# Altium footprint library GBA.PcbLib: 115 footprints (part 1 of 8)
Each footprint in its own frame and in the unit in brackets; x right, y up, seen from the top. Pads: shape width x height; smd on the part's side, far side on the other; paste and mask are expansions set on the pad; w line width, h text height; cw(c..) or ccw(c..) is an arc to the next point about the centre after c.
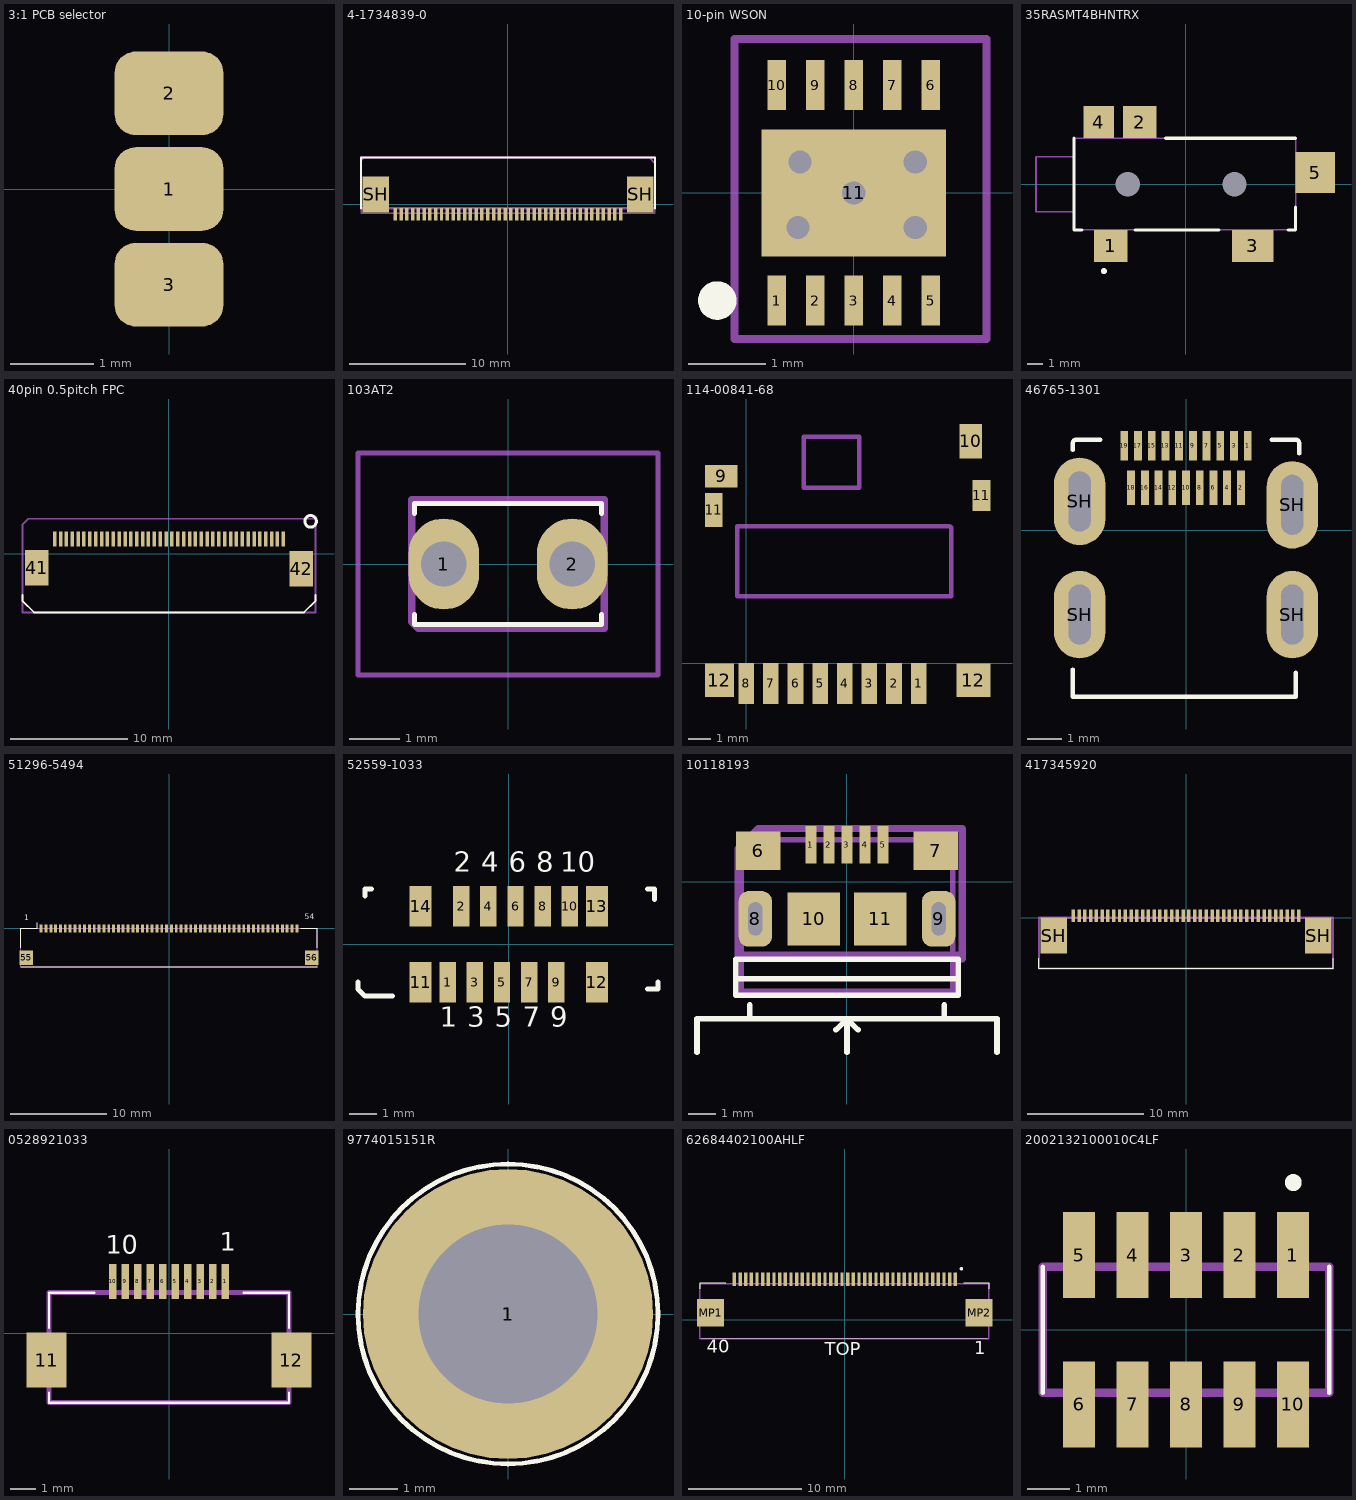
[diagram p0: the footprints below, top view; thin cyan lines are the x and y axes]

## 3:1 PCB selector [mm]
pads (3):
  rrect50% 1.3x1 smd: 1(0,0) 2(0,1.143) 3(0,-1.143)

## 4-1734839-0 [mm]
pads (42):
  rect 0.3x1.1 smd: 1(9.75,-0.85) 2(9.25,-0.85) 3(8.75,-0.85) 4(8.25,-0.85) 5(7.75,-0.85) 6(7.25,-0.85) 7(6.75,-0.85) 8(6.25,-0.85) 9(5.75,-0.85) 10(5.25,-0.85) 11(4.75,-0.85) 12(4.25,-0.85) 13(3.75,-0.85) 14(3.25,-0.85) 15(2.75,-0.85) 16(2.25,-0.85) 17(1.75,-0.85) 18(1.25,-0.85) 19(0.75,-0.85) 20(0.25,-0.85) 21(-0.25,-0.85) 22(-0.75,-0.85) 23(-1.25,-0.85) 24(-1.75,-0.85) 25(-2.25,-0.85) 26(-2.75,-0.85) 27(-3.25,-0.85) 28(-3.75,-0.85) 29(-4.25,-0.85) 30(-4.75,-0.85) 31(-5.25,-0.85) 32(-5.75,-0.85) 33(-6.25,-0.85) 34(-6.75,-0.85) 35(-7.25,-0.85) 36(-7.75,-0.85) 37(-8.25,-0.85) 38(-8.75,-0.85) 39(-9.25,-0.85) 40(-9.75,-0.85)
  rect 2.3x3.1 smd: SH(-11.42,0.85) SH(11.42,0.85)
Top Overlay:
  lines w0.2: -12.715,-0.35 -12.715,4.05 12.715,4.05 12.715,-0.35
Top Designator:
  lines w0.127: -12.7,-0.776 12.7,-0.776 12.7,3.542 12.192,4.05 -12.446,4.05 -12.7,3.796 -12.7,-0.776
  text ".Designator" at -5.842,1.358 h2.5
Mechanical 13:
  lines w0.2: -12.715,-0.35 12.715,-0.35 12.715,4.05 -12.715,4.05 -12.715,-0.35
3D body "4-1734839-0.stp": height 2.05, standoff 0, extent -12.715,-1.27 12.715,3.84

## 10-pin WSON [mm] "8 PIN POWER PAD TEXAS"
height 1.1
pads (11):
  rect 0.24x0.65 smd: 1(-1,-1.4) 2(-0.5,-1.4) 3(0,-1.4) 4(0.5,-1.4) 5(1,-1.4) 6(1,1.4) 7(0.5,1.4) 8(0,1.4) 9(-0.5,1.4) 10(-1,1.4)
  rect 2.4x1.65 smd: 11(0,0)
via -0.725,-0.45 diameter 0.5 hole 0.3
via -0.7,0.4 diameter 0.5 hole 0.3
via 0.8,0.4 diameter 0.5 hole 0.3
via 0.8,-0.45 diameter 0.5 hole 0.3
via 0,0 diameter 0.5 hole 0.3
Top Overlay:
  circle w0.25: c-1.775,-1.4 r0.125
Top Designator (Mech29):
  lines w0.1: -1.549,-1.9 1.725,-1.9 1.725,2 -1.549,2 -1.549,-1.9
  text ".Designator" at -0.797,0.321 h1
3D body "3x310WSON.step": height 0.7, standoff 0.01, extent -1.5,-1.505 1.5,1.505

## 35RASMT4BHNTRX [mm]
pads (7):
  rect 2.2x2.1 smd: 1(-4.9,-4.05) 2(-3,4.05)
  rect 2.7x2.1 smd: 3(4.4,-4.05)
  rect 2x2.1 smd: 4(-5.7,4.05)
  rect 2.6x2.7 smd: 5(8.5,0.75)
  round 0.8 hole 1.6 unplated: MH1(-3.8,0) MH2(3.2,0)
Top Overlay:
  lines w0.2: -7.3,3 -7.3,-3 -6.8,-3 ; -3.3,-3 2.2,-3 ; -1.3,3 7.2,3 ; 6.7,-3 7.2,-3 7.2,-1.5 ; -5.45,-5.7 ccw(c-5.35,-5.7) -5.25,-5.7 ccw(c-5.35,-5.7) -5.45,-5.7
Top Designator:
  lines w0.1: -7.3,-1.8 -9.8,-1.8 -9.8,1.8 -7.3,1.8 ; -7.3,-3 -7.3,3 7.2,3 7.2,-3 -7.3,-3
  text ".Designator" at -1.651,0.635 h1
3D body "35RASMT4BHNTRX.STEP": height 5.1, standoff -0.89, extent -9.71,-4.562 9.29,4.43

## 40pin 0.5pitch FPC [mm]
pads (42):
  rect 0.3x1.25 smd: 1(9.75,1.27) 2(9.25,1.27) 3(8.75,1.27) 4(8.25,1.27) 5(7.75,1.27) 6(7.25,1.27) 7(6.75,1.27) 8(6.25,1.27) 9(5.75,1.27) 10(5.25,1.27) 11(4.75,1.27) 12(4.25,1.27) 13(3.75,1.27) 14(3.25,1.27) 15(2.75,1.27) 16(2.25,1.27) 17(1.75,1.27) 18(1.25,1.27) 19(0.75,1.27) 20(0.25,1.27) 21(-0.25,1.27) 22(-0.75,1.27) 23(-1.25,1.27) 24(-1.75,1.27) 25(-2.25,1.27) 26(-2.75,1.27) 27(-3.25,1.27) 28(-3.75,1.27) 29(-4.25,1.27) 30(-4.75,1.27) 31(-5.25,1.27) 32(-5.75,1.27) 33(-6.25,1.27) 34(-6.75,1.27) 35(-7.25,1.27) 36(-7.75,1.27) 37(-8.25,1.27) 38(-8.75,1.27) 39(-9.25,1.27) 40(-9.75,1.27)
  rect 2x3 smd: 41(-11.29,-1.18) 42(11.29,-1.27)
Top Overlay:
  circle w0.254: c12.075,2.775 r0.5
  lines w0.15: -12.5,-3.5 -12.5,-4 -11.5,-5 11.5,-5 12.5,-4 12.5,-3.5
Top Designator (Mech29):
  lines w0.15: -12.5,-5 12.5,-5 12.5,3 -12,3 -12.5,2.5 -12.5,-1 -12.5,-5
  text ".Designator" at -5.5,-2 h0.8
3D body "c-4-1734592-0-c-3d.stp": height 2.1, standoff 0.05, extent -12.715,-3.96 12.715,1.15

## 103AT2 [mm]
pads (2):
  oval 1.4x1.8 hole 0.9: 1(-1.27,0) 2(1.27,0)
Top Overlay:
  lines w0.1: -1.85,-1 -1.85,-1.2 1.85,-1.2 1.85,-1 ; -1.85,1 -1.85,1.2 1.85,1.2 1.85,1
Mechanical 20:
  lines w0.1: -2.97,-2.2 -2.97,2.2 2.97,2.2 2.97,-2.2 -2.97,-2.2
Top Designator (Mech29):
  lines w0.15: -1.905,-1.143 -1.778,-1.27 1.905,-1.27 1.905,1.27 -1.905,1.27 -1.905,-1.143
  text ".Designator" at -1.27,0 h0.8
3D body "Semitec103AT-2.stp": height 8, standoff -5, extent -1.85,-1.2 1.85,1.2

## 114-00841-68 [mm] "SD Connector"
pads (14):
  rect 0.7x1.85 smd: 1(7.7,-0.9) 2(6.6,-0.9) 3(5.5,-0.9) 4(4.4,-0.9) 5(3.3,-0.9) 6(2.2,-0.9) 7(1.1,-0.9) 8(0,-0.9)
  rect 1.45x1 smd: 9(-1.125,8.35)
  rect 1x1.55 smd: 10(10.025,9.925)
  rect 0.8x1.5 smd: 11(-1.45,6.85)
  rect 0.8x1.4 smd: 11(10.5,7.5)
  rect 1.3x1.5 smd: 12(-1.2,-0.75)
  rect 1.5x1.5 smd: 12(10.15,-0.75)
Mechanical 15:
  lines w0.2: -0.4,3 -0.4,6.125 9.1,6.125 9.15,6.075 9.15,3 -0.4,3 ; 2.575,7.85 5.05,7.85 5.05,10.125 2.575,10.125 2.575,7.85
3D body "114-00841-68.STEP": height 1.61, standoff 0.01, extent -1.425,-1.45 10.575,10.15

## 46765-1301 [mm]
pads (23):
  rect 0.23x0.85 smd: 1(1.8,2.463) 3(1.4,2.463) 5(1,2.463) 7(0.6,2.463) 9(0.2,2.463) 11(-0.2,2.463) 13(-0.6,2.463) 15(-1,2.463) 17(-1.4,2.463) 19(-1.8,2.463)
  rect 0.23x1 smd: 2(1.6,1.238) 4(1.2,1.238) 6(0.8,1.238) 8(0.4,1.238) 10(0,1.238) 12(-0.4,1.238) 14(-0.8,1.238) 16(-1.2,1.238) 18(-1.6,1.238)
  oval 1.5x2.55 hole 0.65 slot 1.75 at 90 deg: SH(-3.1,-2.462) SH(-3.1,0.838) SH(3.1,-2.462) SH(3.1,0.738)
Top Overlay:
  lines w0.127: -3.3,-4.062 -3.3,-4.862 3.2,-4.862 3.2,-4.162 ; -3.3,2.338 -3.3,2.538 cw(c-3.2,2.538) -3.2,2.638 -2.5,2.638 ; 2.5,2.638 3.2,2.638 cw(c3.2,2.538) 3.3,2.538 3.3,2.238
Top Designator (Mech29):
  text ".Designator" at -1.6,-2 h1
3D body "467651301.stp": height 3.02, standoff -0.5, extent -3.275,-4.898 3.225,2.602

## 51296-5494 [mm]
pads (56):
  rect 0.3x0.8 smd: 1(-13.25,0) 2(-12.75,0) 3(-12.25,0) 4(-11.75,0) 5(-11.25,0) 6(-10.75,0) 7(-10.25,0) 8(-9.75,0) 9(-9.25,0) 10(-8.75,0) 11(-8.25,0) 12(-7.75,0) 13(-7.25,0) 14(-6.75,0) 15(-6.25,0) 16(-5.75,0) 17(-5.25,0) 18(-4.75,0) 19(-4.25,0) 20(-3.75,0) 21(-3.25,0) 22(-2.75,0) 23(-2.25,0) 24(-1.75,0) 25(-1.25,0) 26(-0.75,0) 27(-0.25,0) 28(0.25,0) 29(0.75,0) 30(1.25,0) 31(1.75,0) 32(2.25,0) 33(2.75,0) 34(3.25,0) 35(3.75,0) 36(4.25,0) 37(4.75,0) 38(5.25,0) 39(5.75,0) 40(6.25,0) 41(6.75,0) 42(7.25,0) 43(7.75,0) 44(8.25,0) 45(8.75,0) 46(9.25,0) 47(9.75,0) 48(10.25,0) 49(10.75,0) 50(11.25,0) 51(11.75,0) 52(12.25,0) 53(12.75,0) 54(13.25,0)
  rect 1.4x1.5 smd: 55(-14.8,-3.05) 56(14.8,-3.05)
Top Overlay:
  lines w0.1: -15.35,-3.955 15.35,-3.955 ; -15.35,-1.978 -15.35,0 -13.668,0 -13.668,0.589 ; 13.668,0 15.35,0 ; 13.711,0 15.35,0 ; 15.35,-1.978 15.35,0
  text "1" at -14.986,0.635 h1
  text "54" at 14.097,0.762 h1
Top Designator (Mech29):
  lines w0.1: -15.35,-3.955 -15.35,0 15.35,0 15.35,-3.955 -15.35,-3.955
  text ".Designator" at -3.048,-2.54 h1
3D body "51296-5494.stp": height 1.25, standoff -0.05, extent -15.367,-4.182 15.333,0.118

## 52559-1033 [mm]
pads (14):
  rect 0.6x1.5 smd: 1(-2.25,-1.4) 2(-1.75,1.4) 3(-1.25,-1.4) 4(-0.75,1.394) 5(-0.25,-1.4) 6(0.25,1.394) 7(0.75,-1.4) 8(1.25,1.394) 9(1.75,-1.4) 10(2.25,1.394)
  rect 0.8x1.5 smd: 11(-3.25,-1.4) 12(3.25,-1.4) 13(3.25,1.4) 14(-3.25,1.4)
Top Overlay:
  lines w0.18: -5.552,-1.4 -5.552,-1.654 -5.298,-1.908 -4.282,-1.908 ; -5.298,1.775 -5.298,2.029 -5.044,2.029 ; 5.116,-1.654 5.497,-1.654 5.497,-1.4 ; 5.116,2.029 5.37,2.029 5.37,1.648
  text "10" at 1.905,2.413 h1.27
  text "8" at 1.016,2.413 h1.27
  text "3" at -1.524,-3.302 h1.27
  text "1" at -2.54,-3.302 h1.27
  text "5" at -0.508,-3.302 h1.27
  text "7" at 0.508,-3.302 h1.27
  text "9" at 1.524,-3.302 h1.27
  text "6" at 0,2.413 h1.27
  text "4" at -1.016,2.413 h1.27
  text "2" at -2.032,2.413 h1.27
Top Designator (Mech29):
  text ".Designator" at -3.012,-0.384 h1.27
3D body "525591033.stp": height 3.9, standoff 0, extent -5.314,-1.598 5.386,1.902

## 10118193 [mm]
pads (11):
  rect 0.4x1.35 smd mask+0.05: 1(-1.3,1.338) 2(-0.65,1.338) 3(0,1.338) 4(0.65,1.338) 5(1.3,1.338)
  rect 1.6x1.4 smd: 6(-3.2,1.113) 7(3.2,1.113)
  rrect60% 1.2x2 hole 0.5 slot 1.2 at 90 deg: 8(-3.3,-1.338) 9(3.3,-1.338)
  rect 1.9x1.9 smd: 10(-1.2,-1.338) 11(1.2,-1.338)
Top Overlay:
  lines w0.2: -5.4,-6.137 -5.4,-4.937 5.4,-4.937 5.4,-6.137 ; -4,-3.488 4,-3.488 ; -3.5,-4.937 -3.5,-4.437 ; -0.4,-5.337 0,-4.937 ; 0,-6.137 0,-4.937 ; 0.4,-5.337 0,-4.937 ; 3.5,-4.937 3.5,-4.437 ; -4,-4.088 4,-4.088 4,-2.788 -4,-2.788 -4,-4.088
Mechanical 16:
  lines w0.2: -3.8,-3.938 -3.8,1.512 3.8,1.512 3.8,-3.938 -3.8,-3.938
Top Designator (Mech29):
  lines w0.254: -3.925,-2.638 4,-2.638 4.15,-2.788 4.15,1.913 -3.2,1.913 -3.925,1.187 -3.925,-2.638
  text ".Designator" at 0.6,-2.538 h1.52
3D body "10118193.step": height 2.85, standoff -0.75, extent -3.929,-4.098 3.928,1.563

## 417345920 [mm]
pads (42):
  rect 0.3x1.1 smd: 1(-9.75,0.15) 2(-9.25,0.15) 3(-8.75,0.15) 4(-8.25,0.15) 5(-7.75,0.15) 6(-7.25,0.15) 7(-6.75,0.15) 8(-6.25,0.15) 9(-5.75,0.15) 10(-5.25,0.15) 11(-4.75,0.15) 12(-4.25,0.15) 13(-3.75,0.15) 14(-3.25,0.15) 15(-2.75,0.15) 16(-2.25,0.15) 17(-1.75,0.15) 18(-1.25,0.15) 19(-0.75,0.15) 20(-0.25,0.15) 21(0.25,0.15) 22(0.75,0.15) 23(1.25,0.15) 24(1.75,0.15) 25(2.25,0.15) 26(2.75,0.15) 27(3.25,0.15) 28(3.75,0.15) 29(4.25,0.15) 30(4.75,0.15) 31(5.25,0.15) 32(5.75,0.15) 33(6.25,0.15) 34(6.75,0.15) 35(7.25,0.15) 36(7.75,0.15) 37(8.25,0.15) 38(8.75,0.15) 39(9.25,0.15) 40(9.75,0.15)
  rect 2.3x3.1 smd: SH(-11.42,-1.55) SH(11.42,-1.55)
Top Overlay:
  lines w0.1: -12.715,-3.5 -12.715,-4.4 12.715,-4.4 12.715,-3.5
Top Designator:
  text ".Designator" at -3.734,-3.251 h1.75
Top Designator (Mech29):
  lines w0.2: -12.715,-4.4 12.715,-4.4 12.715,0 -12.715,0 -12.715,-4.4
3D body "4-1734592-0.stp": height 2.05, standoff 0, extent -12.715,-4.62 12.715,0.49

## 0528921033 [mm]
pads (12):
  rect 0.3x1.4 smd: 1(2.25,2.075) 2(1.75,2.075) 3(1.25,2.075) 4(0.75,2.075) 5(0.25,2.075) 6(-0.25,2.075) 7(-0.75,2.075) 8(-1.25,2.075) 9(-1.75,2.075) 10(-2.25,2.075)
  rect 1.6x2.2 smd: 11(-4.9,-1.075) 12(4.9,-1.075)
Top Overlay:
  lines w0.1: -4.8,-2.375 -4.8,-2.775 4.8,-2.775 4.8,-2.375 ; -4.8,0.225 -4.8,1.625 -3,1.625 ; 3,1.625 4.8,1.625 4.8,0.225
  text "1" at 2.032,3.048 h1.27
  text "10" at -2.54,2.921 h1.27
Mechanical 13:
  lines w0.2: -4.8,-2.775 4.8,-2.775 4.8,1.625 -4.8,1.625 -4.8,-2.775
Top Designator (Mech29):
  text ".Designator" at -3.937,-1.62 h1.52
3D body "528921033.stp": height 2, standoff -0.04, extent -5.2,-3.294 5.2,2.206

## 9774015151R [mm]
pads (2):
  round 1.85 hole 3.7 unplated: 1(0,0)
  round 6 smd: 1(0,0)
Top Overlay:
  lines w0.1: -3.1,0 cw(c0,0) 3.1,0 cw(c0,0) -3.1,0
Top Designator:
  text ".Designator" at -2.54,-0.381 h1
Mechanical 13:
  lines w0.2: -2.55,0 cw(c0,0) 2.55,0 cw(c0,0) -2.55,0
3D body "Download_STP_9774015151R_rev1.stp": height 1.5, standoff -1.4, extent -2.55,-2.547 2.55,2.547

## 62684402100AHLF [mm]
pads (42):
  rect 0.3x1.2 smd: 1(9.75,3.575) 2(9.25,3.575) 3(8.75,3.575) 4(8.25,3.575) 5(7.75,3.575) 6(7.25,3.575) 7(6.75,3.575) 8(6.25,3.575) 9(5.75,3.575) 10(5.25,3.575) 11(4.75,3.575) 12(4.25,3.575) 13(3.75,3.575) 14(3.25,3.575) 15(2.75,3.575) 16(2.25,3.575) 17(1.75,3.575) 18(1.25,3.575) 19(0.75,3.575) 20(0.25,3.575) 21(-0.25,3.575) 22(-0.75,3.575) 23(-1.25,3.575) 24(-1.75,3.575) 25(-2.25,3.575) 26(-2.75,3.575) 27(-3.25,3.575) 28(-3.75,3.575) 29(-4.25,3.575) 30(-4.75,3.575) 31(-5.25,3.575) 32(-5.75,3.575) 33(-6.25,3.575) 34(-6.75,3.575) 35(-7.25,3.575) 36(-7.75,3.575) 37(-8.25,3.575) 38(-8.75,3.575) 39(-9.25,3.575) 40(-9.75,3.575)
  rect 2.4x2.4 smd: MP1(-11.85,0.621) MP2(11.85,0.621)
Top Overlay:
  lines w0.1: -12.623,-1.624 12.573,-1.651 ; -12.75,3.275 -10.5,3.275 -12.75,3.275 ; -12.75,3.275 -12.75,2.75 -12.75,3.275 ; 12.75,3.275 12.75,2.75 12.75,3.275 ; 12.75,3.275 10.5,3.275 12.75,3.275
  lines w0.2: 10.287,4.472 cw(c10.287,4.522) 10.287,4.572 ; 10.287,4.472 ccw(c10.287,4.522) 10.287,4.572 ; 10.287,4.472 cw(c10.287,4.522) 10.287,4.572
  text "1" at 11.43,-3.429 h2
  text "TOP" at -1.778,-3.535 h2
  text "40" at -12.192,-3.281 h2
Top Designator:
  lines w0.127: -12.827,-1.651 -12.827,3.175 12.7,3.175 12.7,-1.651 -12.827,-1.651
  text ".Designator" at -1.778,-0.32 h1
3D body "s62684-402100alf.stp": height 2.02, standoff -0.03, extent -12.75,-1.784 12.75,3.816

## 2002132100010C4LF [mm]
pads (10):
  rect 0.76x2.05 smd: 1(2.54,1.775) 2(1.27,1.775) 3(0,1.775) 4(-1.27,1.775) 5(-2.54,1.775) 6(-2.54,-1.775) 7(-1.27,-1.775) 8(0,-1.775) 9(1.27,-1.775) 10(2.54,-1.775)
Top Overlay:
  lines w0.1: -3.405,-1.5 -3.405,1.5 ; 3.405,-1.5 3.405,1.5
  lines w0.3: 2.5,3.5 cw(c2.55,3.5) 2.6,3.5 cw(c2.55,3.5) 2.5,3.5
Mechanical 13:
  lines w0.2: -3.405,-1.5 -3.405,1.5 3.405,1.5 3.405,-1.5 -3.405,-1.5
Top Designator (Mech29):
  text ".Designator" at -1.905,-0.381 h1
3D body "20021321-1010xxlfc.stp": height 4.5, standoff 0, extent -3.405,-2.25 3.405,2.25